# Altium footprint library OT Library.PcbLib: 396 footprints (part 3 of 25)
Each footprint in its own frame and in the unit in brackets; x right, y up, seen from the top. Pads: shape width x height; smd on the part's side, far side on the other; paste and mask are expansions set on the pad; w line width, h text height; cw(c..) or ccw(c..) is an arc to the next point about the centre after c.
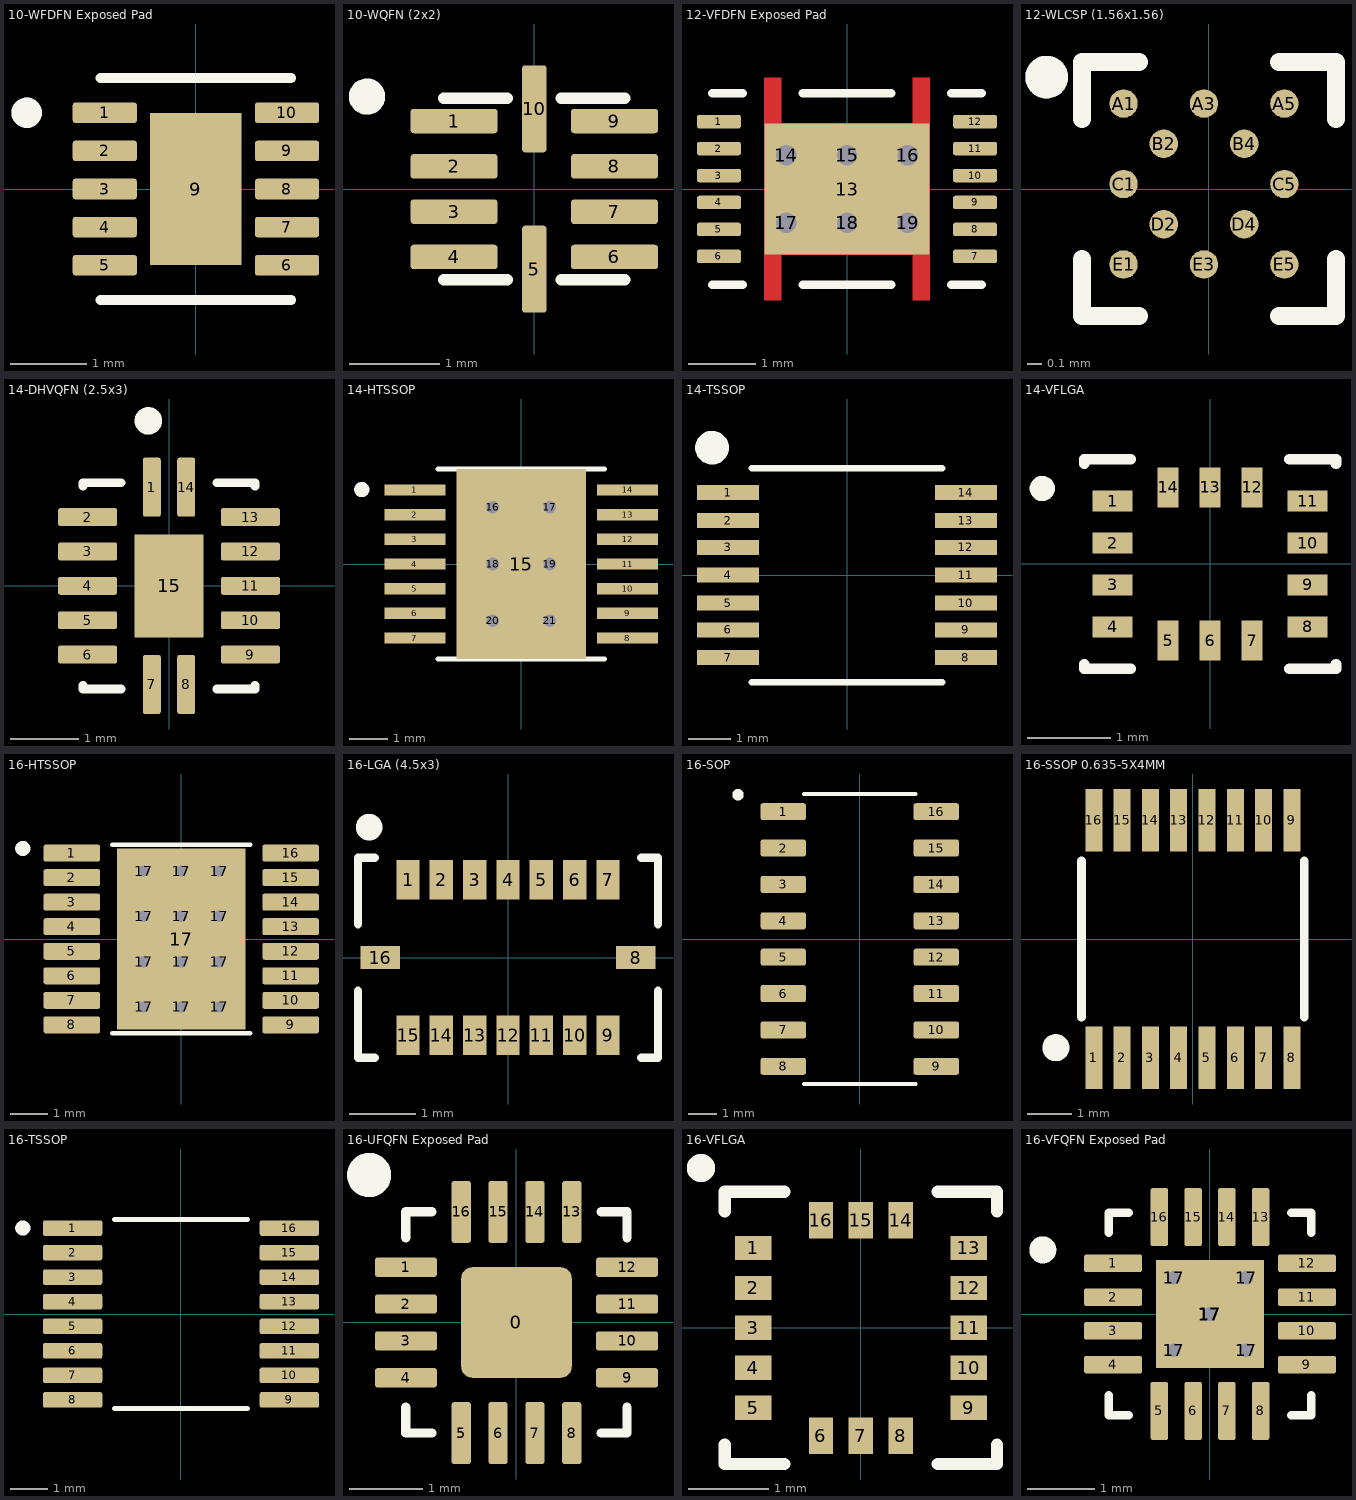
[diagram p2: the footprints below, top view; thin cyan lines are the x and y axes]

## 10-WFDFN Exposed Pad [mm] "10-SON (2.5x2.5)"
pads (11):
  rrect25% 0.84x0.27 smd: 1(-1.195,1) 2(-1.195,0.5) 3(-1.195,0) 4(-1.195,-0.5) 5(-1.195,-1) 6(1.195,-1) 7(1.195,-0.5) 8(1.195,0) 9(1.195,0.5) 10(1.195,1)
  rect 1.2x2 smd paste-2: 9(0,0)
Top Overlay:
  circle w0.2: c-2.22,1 r0.1
  lines w0.127: -1.25,-1.455 1.25,-1.455 ; -1.25,1.455 1.25,1.455
Top Paste:
  region: 0.379,-0.633 -0.379,-0.633 -0.379,0.633 0.379,0.633
3D Top:
  circle w0.2: c-2.22,1 r0.1
3D body: height 0.75, standoff -0.05, extent -1.25,-1.25 1.25,1.25

## 10-WQFN (2x2) [mm]
pads (10):
  rrect25% 0.96x0.27 smd: 1(-0.885,0.75) 2(-0.885,0.25) 3(-0.885,-0.25) 4(-0.885,-0.75) 6(0.885,-0.75) 7(0.885,-0.25) 8(0.885,0.25) 9(0.885,0.75)
  rrect25% 0.27x0.96 smd: 5(0,-0.885) 10(0,0.885)
Top Overlay:
  circle w0.2: c-1.845,1.02 r0.1
  lines w0.127: -1,-1 -0.3,-1 ; -1,1 -0.3,1 ; 0.3,-1 0.65,-1 0.7,-1 1,-1 ; 0.3,1 1,1
3D body: height 0.8, standoff 0, extent -1,-1 1,1

## 12-VFDFN Exposed Pad [mm] "12-SON (2.5x4)"
pads (19):
  rrect30% 0.65x0.2 smd: 1(-1.9,1) 2(-1.9,0.6) 3(-1.9,0.2) 4(-1.9,-0.2) 5(-1.9,-0.6) 6(-1.9,-1) 7(1.9,-1) 8(1.9,-0.6) 9(1.9,-0.2) 10(1.9,0.2) 11(1.9,0.6)
  rrect30% 0.65x0.2 smd paste+0 mask+0.102: 12(1.9,1)
  rect 2.45x1.95 smd paste-1: 13(0,0)
  round 0.5 hole 0.3 unplated: 14(-0.9,0.5) 15(0,0.5) 16(0.9,0.5) 17(-0.9,-0.5) 18(0,-0.5) 19(0.9,-0.5)
Top Layer:
  region: 1.225,-1.65 0.975,-1.65 0.975,-0.975 -0.975,-0.975 -0.975,-1.65 -1.225,-1.65 -1.225,1.65 -0.975,1.65 -0.975,0.975 0.975,0.975 0.975,1.65 1.225,1.65
Top Overlay:
  lines w0.127: -2,-1.42 -1.545,-1.42 ; -2,1.42 -1.545,1.42 ; -0.655,-1.42 0.655,-1.42 ; -0.655,1.42 0.655,1.42 ; 1.545,-1.42 2,-1.42 ; 1.545,1.42 2,1.42
Top Paste:
  region: -0.1,0.1 -1.1,0.1 -1.1,0.9 -0.1,0.9
  region: 1.1,0.1 0.1,0.1 0.1,0.9 1.1,0.9
  region: -0.1,-0.9 -1.1,-0.9 -1.1,-0.1 -0.1,-0.1
  region: 1.1,-0.9 0.1,-0.9 0.1,-0.1 1.1,-0.1
  region: -0.975,1.1 -1.225,1.1 -1.225,1.625 -0.975,1.625
  region: 1.225,1.1 0.975,1.1 0.975,1.625 1.225,1.625
  region: -0.975,-1.625 -1.225,-1.625 -1.225,-1.1 -0.975,-1.1
  region: 1.225,-1.625 0.975,-1.625 0.975,-1.1 1.225,-1.1
Top Solder:
  region: 1.275,-1.7 0.925,-1.7 0.925,-1.025 -0.925,-1.025 -0.925,-1.7 -1.275,-1.7 -1.275,1.7 -0.925,1.7 -0.925,1.025 0.925,1.025 0.925,1.7 1.275,1.7
3D body: height 0.95, standoff 0, extent -2.05,-1.25 2.05,1.25

## 12-WLCSP (1.56x1.56) [mm] "12-UFBGA, WLCSP"
pads (12):
  round 0.2 smd: A1(-0.601,0.601) A3(-0.035,0.601) A5(0.531,0.601) B2(-0.318,0.318) B4(0.248,0.318) C1(-0.601,0.035) C5(0.531,0.035) D2(-0.318,-0.248) D4(0.248,-0.248) E1(-0.601,-0.531) E3(-0.035,-0.531) E5(0.531,-0.531)
Top Overlay:
  circle w0.15: c-1.142,0.787 r0.075
  lines w0.127: -0.894,-0.493 -0.894,-0.894 -0.493,-0.894 ; -0.894,0.493 -0.894,0.894 -0.493,0.894 ; 0.493,-0.894 0.894,-0.894 0.894,-0.493 ; 0.493,0.894 0.894,0.894 0.894,0.493
3D Top:
  circle w0.15: c-1.142,0.787 r0.075
3D body: height 0.6, standoff 0, extent -0.78,-0.78 0.78,0.78

## 14-DHVQFN (2.5x3) [mm] "14-DHVQFN Exposed Pad"
pads (15):
  rrect25% 0.26x0.86 smd: 1(-0.25,1.435) 7(-0.25,-1.435) 8(0.25,-1.435) 14(0.25,1.435)
  rrect25% 0.86x0.26 smd: 2(-1.185,1) 3(-1.185,0.5) 4(-1.185,0) 5(-1.185,-0.5) 6(-1.185,-1) 9(1.185,-1) 10(1.185,-0.5) 11(1.185,0) 12(1.185,0.5) 13(1.185,1)
  rect 1x1.5 smd paste-2: 15(0,0)
Top Overlay:
  circle w0.2: c-0.3,2.4 r0.1
  lines w0.127: -1.25,-1.45 -1.25,-1.5 -0.7,-1.5 ; -1.25,1.45 -1.25,1.5 -0.7,1.5 ; 0.7,-1.5 1.25,-1.5 1.25,-1.45 ; 0.7,1.5 1.25,1.5 1.25,1.45
Top Paste:
  region: 0.32,-0.47 -0.32,-0.47 -0.32,0.47 0.32,0.47
3D body: height 1, standoff 0, extent -1.25,-1.5 1.25,1.5

## 14-HTSSOP [mm] "14-PowerTSSOP (0.173\", 4.40mm Width)"
pads (21):
  rect 1.6x0.3 smd paste-2: 1(-2.8,1.95) 2(-2.8,1.3) 3(-2.8,0.65) 4(-2.8,0) 5(-2.8,-0.65) 6(-2.8,-1.3) 7(-2.8,-1.95) 8(2.8,-1.95) 9(2.8,-1.3) 10(2.8,-0.65) 11(2.8,0) 12(2.8,0.65) 13(2.8,1.3) 14(2.8,1.95)
  rect 3.4x5 smd paste-3 mask+0: 15(0,0)
  round 0.44 hole 0.33 mask+0: 16(-0.75,1.5) 17(0.75,1.5) 20(-0.75,-1.5) 21(0.75,-1.5)
  round 0.44 hole 0.33: 18(-0.75,0) 19(0.75,0)
Top Overlay:
  circle w0.2: c-4.2,1.96 r0.1
  lines w0.127: -2.2,-2.5 2.2,-2.5 ; -2.2,2.5 2.2,2.5
Top Paste:
  region: 1.23,-1.155 -1.23,-1.155 -1.23,1.155 1.23,1.155
  region: -2.025,1.825 -3.575,1.825 -3.575,2.075 -2.025,2.075
  region: -2.025,1.175 -3.575,1.175 -3.575,1.425 -2.025,1.425
  region: -2.025,0.525 -3.575,0.525 -3.575,0.775 -2.025,0.775
  region: -2.025,-2.075 -3.575,-2.075 -3.575,-1.825 -2.025,-1.825
  region: -2.025,-1.425 -3.575,-1.425 -3.575,-1.175 -2.025,-1.175
  region: -2.025,-0.775 -3.575,-0.775 -3.575,-0.525 -2.025,-0.525
  region: -2.025,-0.125 -3.575,-0.125 -3.575,0.125 -2.025,0.125
  region: 3.575,1.825 2.025,1.825 2.025,2.075 3.575,2.075
  region: 3.575,1.175 2.025,1.175 2.025,1.425 3.575,1.425
  region: 3.575,0.525 2.025,0.525 2.025,0.775 3.575,0.775
  region: 3.575,-2.075 2.025,-2.075 2.025,-1.825 3.575,-1.825
  region: 3.575,-1.425 2.025,-1.425 2.025,-1.175 3.575,-1.175
  region: 3.575,-0.775 2.025,-0.775 2.025,-0.525 3.575,-0.525
  region: 3.575,-0.125 2.025,-0.125 2.025,0.125 3.575,0.125
Top Solder:
  region: 1.23,-1.155 -1.23,-1.155 -1.23,1.155 1.23,1.155
3D body: height 1.2, standoff 0, extent -3.2,-2.54 3.2,2.46

## 14-TSSOP [mil] "14-TSSOP (0.173\", 4.40mm Width)"
pads (14):
  rect 58x14 smd: 1(-111,77) 2(-111,51) 3(-111,26) 4(-111,0) 5(-111,-26) 6(-111,-51) 7(-111,-77) 8(111,-77) 9(111,-51) 10(111,-26) 11(111,0) 12(111,26) 13(111,51) 14(111,77)
Top Overlay:
  circle w15.75: c-126,119 r7.87
  lines w6: -89,-100 89,-100 ; -89,100 -12,100 12,100 89,100
3D body: height 47.24, standoff 0, extent -125.98,-98.42 125.99,98.43

## 14-VFLGA [mm] "14-LGA (2.5x3)"
height 0.87
pads (14):
  rect 0.475x0.25 smd: 1(-1.162,0.75) 2(-1.162,0.25) 3(-1.162,-0.25) 4(-1.162,-0.75) 8(1.162,-0.75) 9(1.162,-0.25) 10(1.162,0.25) 11(1.162,0.75)
  rect 0.25x0.475 smd: 5(-0.5,-0.913) 6(0,-0.913) 7(0.5,-0.913) 12(0.5,0.913) 13(0,0.913) 14(-0.5,0.913)
Top Overlay:
  circle w0.15: c-2,0.9 r0.075
  lines w0.127: -1.5,-1.195 -1.5,-1.25 -0.945,-1.25 ; -1.5,1.195 -1.5,1.25 -0.945,1.25 ; 0.945,-1.25 1.5,-1.25 1.5,-1.195 ; 0.945,1.25 1.5,1.25 1.5,1.195
3D body: height 0.87, standoff 0, extent -1.5,-1.25 1.5,1.25

## 16-HTSSOP [mm] "16-PowerTSSOP (0.173\", 4.40mm Width)"
height 1.2
pads (29):
  rrect25% 1.5x0.45 smd: 1(-2.9,2.275) 2(-2.9,1.625) 3(-2.9,0.975) 4(-2.9,0.325) 5(-2.9,-0.325) 6(-2.9,-0.975) 7(-2.9,-1.625) 8(-2.9,-2.275) 9(2.9,-2.275) 10(2.9,-1.625) 11(2.9,-0.975) 12(2.9,-0.325) 13(2.9,0.325) 14(2.9,0.975) 15(2.9,1.625) 16(2.9,2.275)
  round 0.6 hole 0.3 mask+0: 17(-1,-1.8) 17(-1,-0.6) 17(-1,0.6) 17(-1,1.8) 17(0,-1.8) 17(0,-0.6) 17(0,0.6) 17(0,1.8) 17(1,-1.8) 17(1,-0.6) 17(1,0.6) 17(1,1.8)
  rect 3.4x4.8 smd paste-3 mask+0: 17(0,0)
Top Overlay:
  circle w0.2: c-4.2,2.4 r0.1
  lines w0.127: -1.83,-2.5 1.83,-2.5 ; -1.83,2.5 1.83,2.5
Top Paste:
  region: 1.23,-1.155 -1.23,-1.155 -1.23,1.155 1.23,1.155
Top Solder:
  region: 1.23,-1.155 -1.23,-1.155 -1.23,1.155 1.23,1.155
3D body: height 1.2, standoff 0, extent -3.2,-2.5 3.2,2.5

## 16-LGA (4.5x3) [mm]
pads (16):
  rect 0.35x0.59 smd: 1(-1.5,1.165) 2(-1,1.165) 3(-0.5,1.165) 4(0,1.165) 5(0.5,1.165) 6(1,1.165) 7(1.5,1.165) 9(1.5,-1.165) 10(1,-1.165) 11(0.5,-1.165) 12(0,-1.165) 13(-0.5,-1.165) 14(-1,-1.165) 15(-1.5,-1.165)
  rect 0.59x0.35 smd: 8(1.915,0) 16(-1.915,0)
Top Overlay:
  circle w0.2: c-2.083,1.956 r0.1
  lines w0.127: -2.25,-0.5 -2.25,-1.5 -2,-1.5 ; -2.25,0.5 -2.25,1.5 -2,1.5 ; 2,-1.5 2.25,-1.5 2.25,-0.5 ; 2,1.5 2.25,1.5 2.25,0.5
3D body: height 1, standoff 0, extent -2.25,-1.5 2.25,1.5

## 16-SOP [mm]
height 1.8
pads (16):
  rrect25% 1.58x0.59 smd: 1(-2.67,4.445) 2(-2.67,3.175) 3(-2.67,1.905) 4(-2.67,0.635) 5(-2.67,-0.635) 6(-2.67,-1.905) 7(-2.67,-3.175) 8(-2.67,-4.445) 9(2.67,-4.445) 10(2.67,-3.175) 11(2.67,-1.905) 12(2.67,-0.635) 13(2.67,0.635) 14(2.67,1.905) 15(2.67,3.175) 16(2.67,4.445)
Top Overlay:
  circle w0.2: c-4.25,5.035 r0.1
  lines w0.127: -1.95,-5.06 1.95,-5.06 ; -1.95,5.06 1.95,5.06
3D body: height 1.6, standoff 0, extent -3,-4.95 3,4.95

## 16-SSOP 0.635-5X4MM [mil] "16-SSOP (0.154\", 3.90mm Width)"
pads (16):
  rect 15x55 smd: 1(-87.5,-105) 2(-62.5,-105) 3(-37.5,-105) 4(-12.5,-105) 5(12.5,-105) 6(37.5,-105) 7(62.5,-105) 8(87.5,-105) 9(87.5,105) 10(62.5,105) 11(37.5,105) 12(12.5,105) 13(-12.5,105) 14(-37.5,105) 15(-62.5,105) 16(-87.5,105)
Top Overlay:
  circle w11.81: c-121,-96 r6.08
  lines w7.87: -98.43,-68.9 -98.43,68.9 ; 98.43,-68.9 98.43,68.9
3D body: height 69, standoff 0, extent -96.51,-118 96.49,118

## 16-TSSOP [mm] "16-TSSOP (0.173\", 4.40mm Width)"
pads (16):
  rrect25% 1.57x0.41 smd: 1(-2.87,2.275) 2(-2.87,1.625) 3(-2.87,0.975) 4(-2.87,0.325) 5(-2.87,-0.325) 6(-2.87,-0.975) 7(-2.87,-1.625) 8(-2.87,-2.275) 9(2.87,-2.275) 10(2.87,-1.625) 11(2.87,-0.975) 12(2.87,-0.325) 13(2.87,0.325) 14(2.87,0.975) 15(2.87,1.625) 16(2.87,2.275)
Top Overlay:
  circle w0.2: c-4.19,2.275 r0.1
  lines w0.127: -1.765,-2.5 1.765,-2.5 ; -1.765,2.5 1.765,2.5
3D body: height 1.2, standoff 0, extent -3.2,-2.5 3.2,2.5

## 16-UFQFN Exposed Pad [mm]
pads (17):
  rrect20% 1.5x1.5 smd: 0(0,0)
  rrect25% 0.84x0.26 smd: 1(-1.5,0.75) 2(-1.5,0.25) 3(-1.5,-0.25) 4(-1.5,-0.75) 9(1.5,-0.75) 10(1.5,-0.25) 11(1.5,0.25) 12(1.5,0.75)
  rrect25% 0.26x0.84 smd: 5(-0.75,-1.5) 6(-0.25,-1.5) 7(0.25,-1.5) 8(0.75,-1.5) 13(0.75,1.5) 14(0.25,1.5) 15(-0.25,1.5) 16(-0.75,1.5)
Top Overlay:
  circle w0.3: c-2,2 r0.15
  lines w0.127: -1.5,-1.15 -1.5,-1.5 -1.15,-1.5 ; -1.5,1.15 -1.5,1.5 -1.15,1.5 ; 1.15,-1.5 1.5,-1.5 1.5,-1.15 ; 1.15,1.5 1.5,1.5 1.5,1.15
3D body: height 0.9, standoff 0, extent -1.537,-1.537 1.537,1.537

## 16-VFLGA [mil] "16-LGA (3x3)"
height 39.37
pads (16):
  rect 18x12 smd: 1(-53,39.37) 2(-53,19.68) 3(-53,0) 4(-53,-19.68) 5(-53,-39.37) 9(53,-39.37) 10(53,-19.68) 11(53,0) 12(53,19.68) 13(53,39.37)
  rect 12x18 smd: 6(-19.68,-53) 7(0,-53) 8(19.68,-53) 14(19.68,53) 15(0,53) 16(-19.68,53)
Top Overlay:
  circle w10: c-78.74,78.74 r1.97
  lines w6: -67,-57.48 -67,-67 -37.79,-67 ; -67,57.48 -67,67 -37.79,67 ; 37.79,-67 67,-67 67,-57.48 ; 37.79,67 67,67 67,57.48
3D body: height 39.09, standoff 0, extent -62,-62.01 62.01,62.01

## 16-VFQFN Exposed Pad [mm] "16-VQFN (3x3)"
pads (22):
  rrect25% 0.86x0.26 smd: 1(-1.435,0.75) 2(-1.435,0.25) 3(-1.435,-0.25) 4(-1.435,-0.75) 9(1.435,-0.75) 10(1.435,-0.25) 11(1.435,0.25) 12(1.435,0.75)
  rrect25% 0.26x0.86 smd: 5(-0.75,-1.435) 6(-0.25,-1.435) 7(0.25,-1.435) 8(0.75,-1.435) 13(0.75,1.435) 14(0.25,1.435) 15(-0.25,1.435) 16(-0.75,1.435)
  round 0.4 hole 0.2 mask+0: 17(-0.533,-0.533) 17(-0.533,0.533) 17(0,0) 17(0.533,-0.533) 17(0.533,0.533)
  rect 1.6x1.6 smd paste-2: 17(0,0)
Top Overlay:
  circle w0.2: c-2.475,0.95 r0.1
  lines w0.127: -1.5,-1.2 -1.5,-1.5 -1.2,-1.5 ; -1.5,1.2 -1.5,1.5 -1.2,1.5 ; 1.2,-1.5 1.5,-1.5 1.5,-1.2 ; 1.2,1.5 1.5,1.5 1.5,1.2
Top Paste:
  region: 0.53,-0.53 -0.53,-0.53 -0.53,0.53 0.53,0.53
3D body: height 1, standoff 0, extent -1.5,-1.5 1.5,1.5